# Altium footprint library my_PcbLib.PcbLib: 58 footprints (part 4 of 4)
Each footprint in its own frame and in the unit in brackets; x right, y up, seen from the top. Pads: shape width x height; smd on the part's side, far side on the other; paste and mask are expansions set on the pad; w line width, h text height; cw(c..) or ccw(c..) is an arc to the next point about the centre after c.
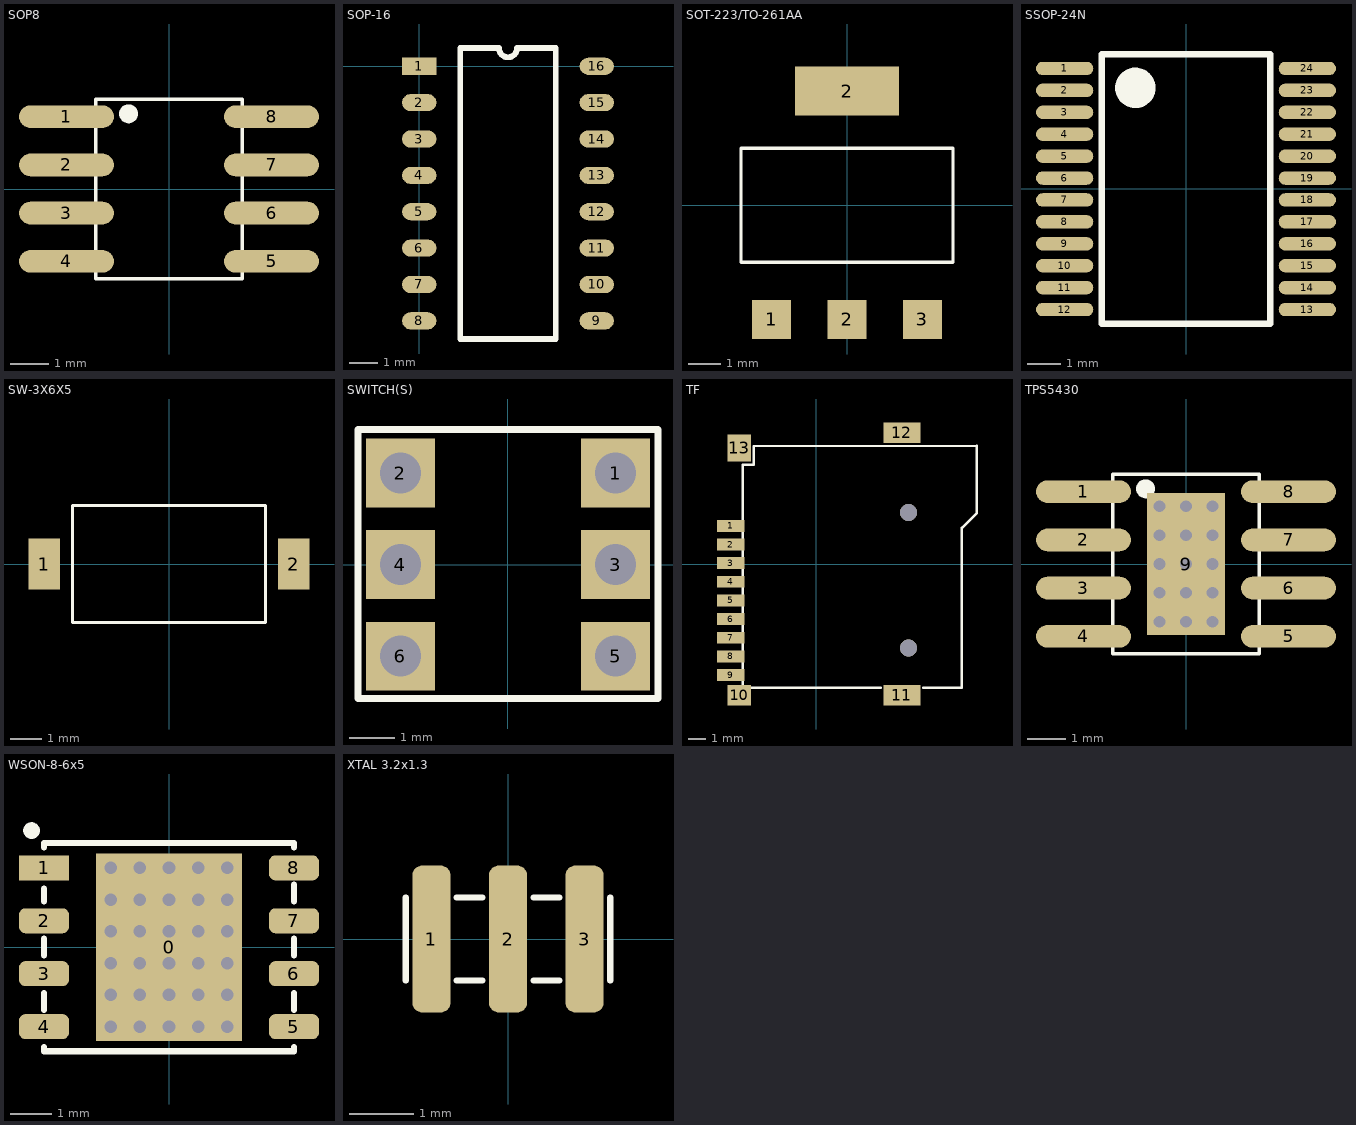
[diagram p3: the footprints below, top view; thin cyan lines are the x and y axes]

## SOP8 [mm] "SOP8"
height 1.75
pads (8):
  oval 2.5x0.6 smd: 1(-2.7,1.905) 2(-2.7,0.635) 3(-2.7,-0.635) 4(-2.7,-1.905) 5(2.7,-1.905) 6(2.7,-0.635) 7(2.7,0.635) 8(2.7,1.905)
Top Overlay:
  circle w0.25: c-1.067,1.981 r0.125
  lines w0.1: -1.93,-2.362 -1.93,2.362 1.93,2.362 1.93,-2.362 -1.93,-2.362
3D body "User Library-FairchildSemi 8-SOP.STEP": height 1.7, standoff 0, extent -3.023,-2.413 2.972,2.413

## SOP-16 [mm]
pads (16):
  rect 1.2x0.6 smd: 1(0,0)
  oval 1.2x0.6 smd: 2(0,-1.27) 3(0,-2.54) 4(0,-3.81) 5(0,-5.08) 6(0,-6.35) 7(0,-7.62) 8(0,-8.89) 9(6.2,-8.89) 10(6.2,-7.62) 11(6.2,-6.35) 12(6.2,-5.08) 13(6.2,-3.81) 14(6.2,-2.54) 15(6.2,-1.27) 16(6.2,0)
Top Overlay:
  lines w0.2: 1.435,-9.525 1.435,0.635 2.782,0.635 ccw(c3.1,0.635) 3.417,0.635 4.765,0.635 4.765,-9.525 1.435,-9.525
3D body "User Library-SOIC-16-2.STEP": height 1.75, standoff 0, extent 0.048,-9.47 6.048,0.53

## SOT-223/TO-261AA [mm]
pads (4):
  rect 1.2x1.2 smd: 1(-2.31,-3.5) 2(0,-3.5) 3(2.31,-3.5)
  rect 3.2x1.5 smd: 2(0,3.5)
Top Overlay:
  lines w0.1: -3.25,-1.75 3.25,-1.75 3.25,1.75 -3.25,1.75 -3.25,-1.75
3D body "User Library-AMS1117-1.STEP": height 1.85, standoff -0.01, extent -3.252,-3.525 3.253,3.475

## SSOP-24N [mm]
height 1.6
pads (24):
  oval 1.7x0.4 smd: 1(-3.6,3.575) 2(-3.6,2.925) 3(-3.6,2.275) 4(-3.6,1.625) 5(-3.6,0.975) 6(-3.6,0.325) 7(-3.6,-0.325) 8(-3.6,-0.975) 9(-3.6,-1.625) 10(-3.6,-2.275) 11(-3.6,-2.925) 12(-3.6,-3.575) 13(3.6,-3.575) 14(3.6,-2.925) 15(3.6,-2.275) 16(3.6,-1.625) 17(3.6,-0.975) 18(3.6,-0.325) 19(3.6,0.325) 20(3.6,0.975) 21(3.6,1.625) 22(3.6,2.275) 23(3.6,2.925) 24(3.6,3.575)
Top Overlay:
  circle w0.6: c-1.5,3 r0.3
  lines w0.2: -2.5,-4 -2.5,4 2.5,4 2.5,-4 -2.5,-4
3D body "TSOP65P760X160-24N.step": height 1.6, standoff 0, extent -3.8,-4 3.8,4

## SW-3X6X5 [mm]
height 3
pads (2):
  rect 1x1.6 smd: 1(-3.937,0) 2(3.937,0)
Top Overlay:
  lines w0.1: -3.05,-1.85 -3.05,1.85 3.05,1.85 3.05,-1.85 -3.05,-1.85
3D body "User Library-KFC-2Pin SMD.STEP": height 4.2, standoff 0, extent -4,-1.75 4,1.75

## SWITCH(S) [mm]
pads (6):
  rect 1.5x1.5 hole 0.9: 1(2.349,2) 2(-2.349,2) 3(2.349,0) 4(-2.349,0) 5(2.349,-2) 6(-2.349,-2)
Top Overlay:
  lines w0.152: -3.277,-2.921 3.277,-2.921 3.277,2.946 -3.277,2.946 -3.277,-2.921
3D body "User Library-KFC-5_8X5_8-02-1.STEP": height 10, standoff -3.6, extent -2.9,-2.925 2.9,2.875

## TF [mm]
pads (13):
  rect 1.6x0.7 smd: 1(-5.05,2.25) 2(-5.05,1.15) 3(-5.05,0.05) 4(-5.05,-1.05) 5(-5.05,-2.15) 6(-5.05,-3.25) 7(-5.05,-4.35) 8(-5.05,-5.45) 9(-5.05,-6.55)
  rect 1.4x1.2 smd: 10(-4.55,-7.75)
  rect 2.2x1.2 smd: 11(5.05,-7.75) 12(5.05,7.75)
  rect 1.4x1.6 smd: 13(-4.55,6.85)
via 5.45,3.05 diameter 1 hole 1
via 5.45,-4.95 diameter 1 hole 1
Top Overlay:
  lines w0.152: -4.348,-7.264 -4.348,5.867 -3.683,5.867 -3.683,6.95 9.47,6.966 9.47,3.018 8.585,2.134 8.585,-7.293 6.325,-7.293 ; -4.343,-7.29 3.785,-7.29

## TPS5430 [mm] "SOP8"
height 1.75
pads (9):
  oval 2.5x0.6 smd: 1(-2.7,1.905) 2(-2.7,0.635) 3(-2.7,-0.635) 4(-2.7,-1.905) 5(2.7,-1.905) 6(2.7,-0.635) 7(2.7,0.635) 8(2.7,1.905)
  rect 2.05x3.75 smd: 9(0,0)
via 0.699,1.524 diameter 0.635 hole 0.305
via 0.699,0.762 diameter 0.635 hole 0.305
via 0.699,0 diameter 0.635 hole 0.305
via 0.699,-0.762 diameter 0.635 hole 0.305
via 0.699,-1.524 diameter 0.635 hole 0.305
via 0,1.524 diameter 0.635 hole 0.305
via 0,0.762 diameter 0.635 hole 0.305
via 0,0 diameter 0.635 hole 0.305
via 0,-0.762 diameter 0.635 hole 0.305
via 0,-1.524 diameter 0.635 hole 0.305
via -0.699,-1.524 diameter 0.635 hole 0.305
via -0.699,-0.762 diameter 0.635 hole 0.305
via -0.699,0 diameter 0.635 hole 0.305
via -0.699,0.762 diameter 0.635 hole 0.305
via -0.699,1.524 diameter 0.635 hole 0.305
Top Overlay:
  circle w0.25: c-1.067,1.981 r0.125
  lines w0.1: -1.93,-2.362 1.93,-2.362 1.93,2.362 -1.93,2.362 -1.93,-2.362
3D body "User Library-FairchildSemi 8-SOP.STEP": height 1.7, standoff 0, extent -3.023,-2.413 2.972,2.413

## WSON-8-6x5 [mm]
height 0.8
pads (9):
  rect 3.5x4.5 smd: 0(0,0)
  rect 1.2x0.6 smd: 1(-3,1.905)
  rrect50% 1.2x0.6 smd: 2(-3,0.635) 3(-3,-0.635) 4(-3,-1.905) 5(3,-1.905) 6(3,-0.635) 7(3,0.635) 8(3,1.905)
via -1.397,1.905 diameter 0.635 hole 0.305
via -0.699,1.905 diameter 0.635 hole 0.305
via 0,1.905 diameter 0.635 hole 0.305
via 1.397,1.905 diameter 0.635 hole 0.305
via 0.699,1.905 diameter 0.635 hole 0.305
via -1.397,1.143 diameter 0.635 hole 0.305
via -1.397,0.381 diameter 0.635 hole 0.305
via -1.397,-0.381 diameter 0.635 hole 0.305
via -1.397,-1.143 diameter 0.635 hole 0.305
via -1.397,-1.905 diameter 0.635 hole 0.305
via -0.699,-1.905 diameter 0.635 hole 0.305
via -0.699,-1.143 diameter 0.635 hole 0.305
via -0.699,-0.381 diameter 0.635 hole 0.305
via -0.699,0.381 diameter 0.635 hole 0.305
via -0.699,1.143 diameter 0.635 hole 0.305
via 0,-1.905 diameter 0.635 hole 0.305
via 0,-1.143 diameter 0.635 hole 0.305
via 0,-0.381 diameter 0.635 hole 0.305
via 0,0.381 diameter 0.635 hole 0.305
via 0,1.143 diameter 0.635 hole 0.305
via 0.699,-1.905 diameter 0.635 hole 0.305
via 0.699,-1.143 diameter 0.635 hole 0.305
via 0.699,-0.381 diameter 0.635 hole 0.305
via 0.699,0.381 diameter 0.635 hole 0.305
via 0.699,1.143 diameter 0.635 hole 0.305
via 1.397,-1.905 diameter 0.635 hole 0.305
via 1.397,-1.143 diameter 0.635 hole 0.305
via 1.397,-0.381 diameter 0.635 hole 0.305
via 1.397,0.381 diameter 0.635 hole 0.305
via 1.397,1.143 diameter 0.635 hole 0.305
Top Overlay:
  circle w0.2: c-3.3,2.8 r0.1
  lines w0.152: -3,-2.4 -3,-2.5 3,-2.5 3,-2.4 ; -3,-1.5 -3,-1.1 ; -3,-0.2 -3,0.2 ; -3,1.1 -3,1.4 ; -3,2.4 -3,2.5 3,2.5 3,2.4 ; 3,-1.5 3,-1.1 ; 3,-0.2 3,0.2 ; 3,1.1 3,1.5

## XTAL 3.2x1.3 [mm]
pads (3):
  rrect50% 0.6x2.3 smd: 1(-1.2,0) 2(0,0) 3(1.2,0)
Top Overlay:
  lines w0.1: -1.6,-0.65 -1.6,0.65 ; -0.8,-0.65 -0.4,-0.65 ; -0.8,0.65 -0.4,0.65 ; 0.4,-0.65 0.8,-0.65 ; 0.4,0.65 0.8,0.65 ; 1.6,-0.65 1.6,0.65
3D body "XTAL 3.2x1.3mm.STEP": height 0.7, standoff 0, extent -1.6,-0.65 1.6,0.65